# Altium schematic symbol library FPGA_Xilinx_Virtex7.SchLib: 34 symbols (part 4 of 26)
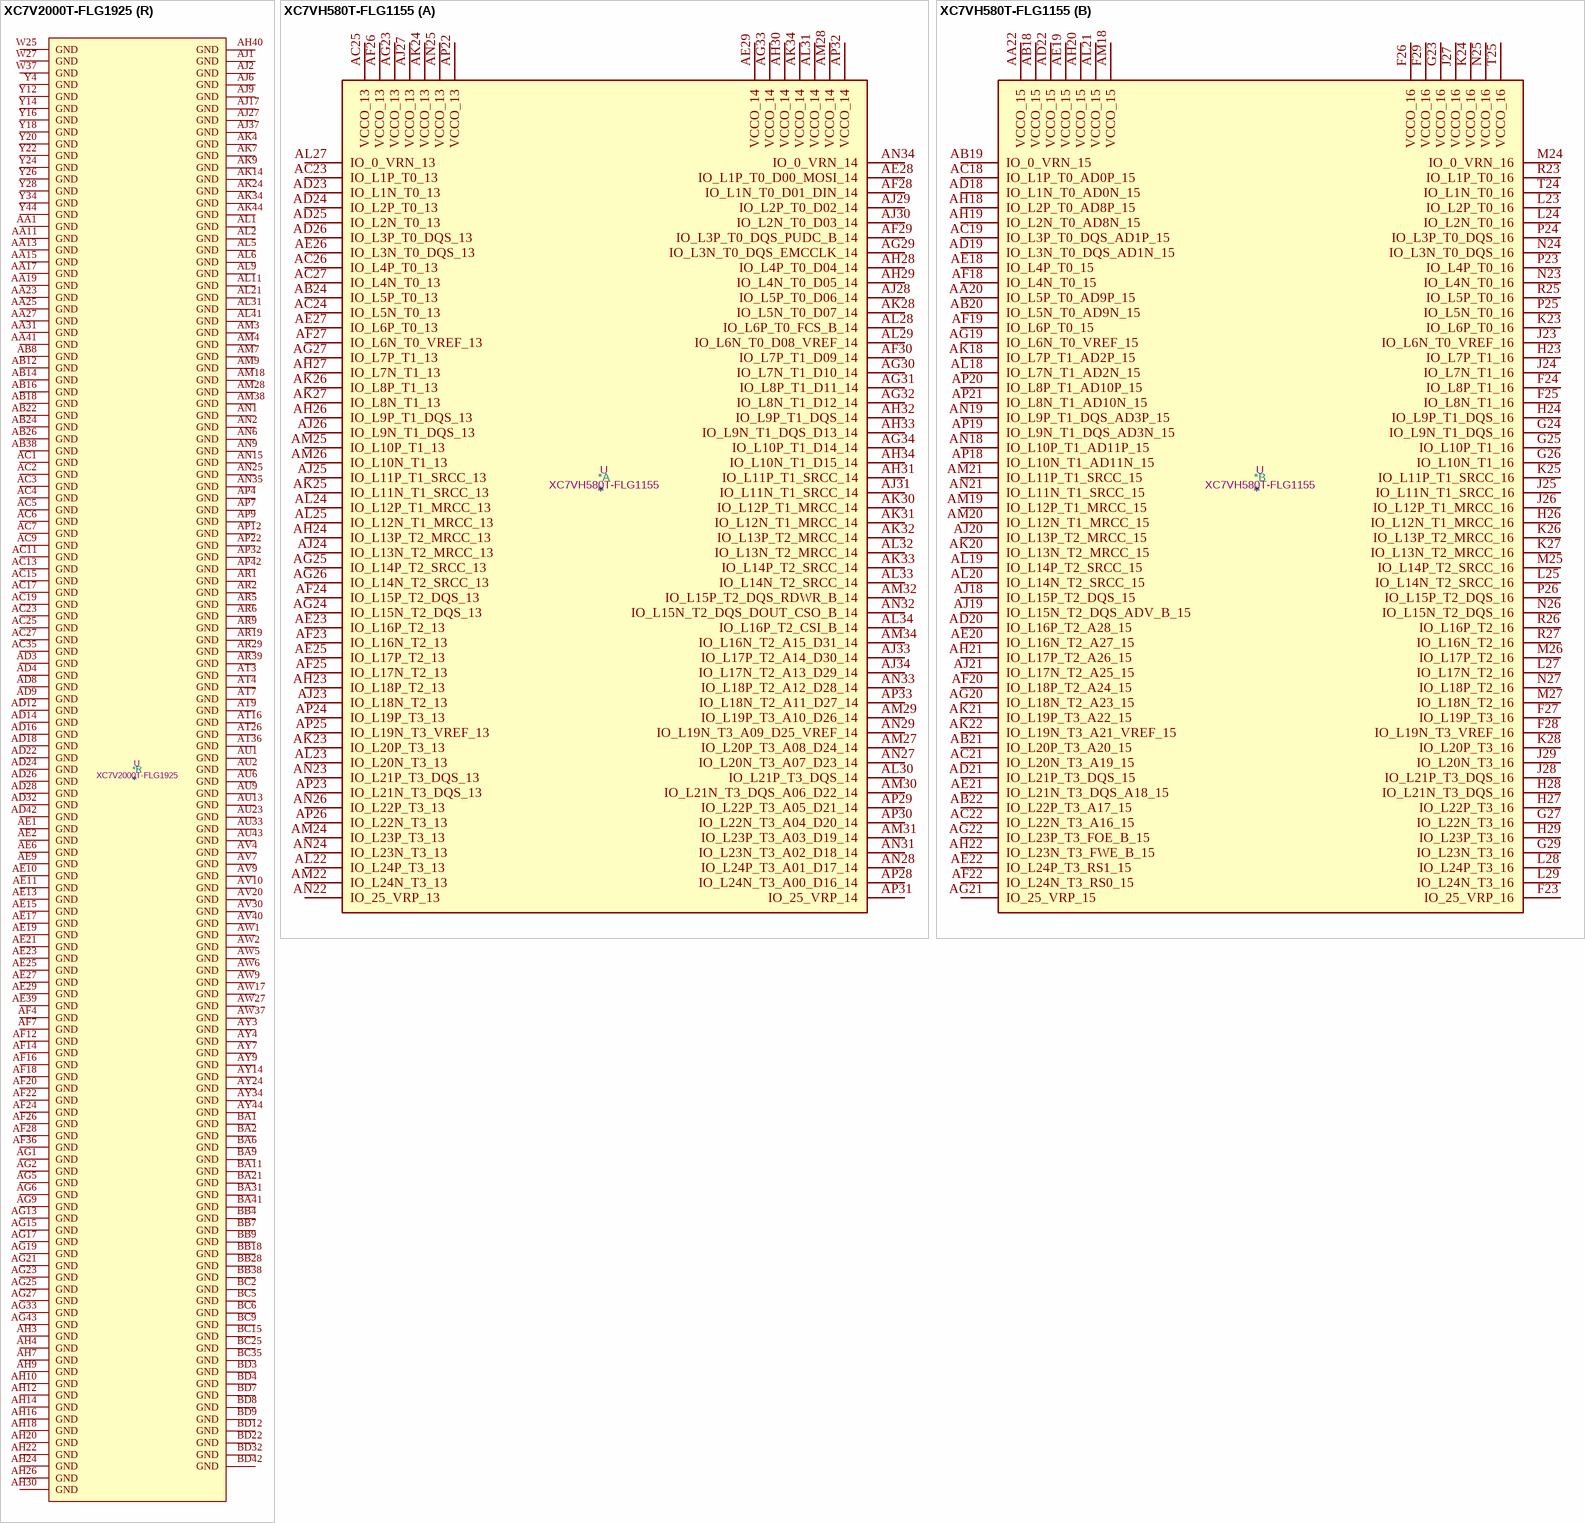
[diagram p175: symbols XC7V2000T-FLG1925 to XC7VH580T-FLG1155]

## XC7V2000T-FLG1925
designator *  value XC7V2000T-FLG1925  Reference: U
ki_keywords: FPGA; ki_description: Virtex 7 T 2000 XC7V2000T-FLG1925
part A pins: AN34 IO_0_VRN_12, AN36 IO_L6P_T0_12, AN37 IO_L2P_T0_12, AN38 IO_L2N_T0_12, AN39 IO_L7P_T1_12, AN40 VCCO_12, AN41 IO_L9P_T1_DQS_12, AP34 IO_L3P_T0_DQS_12, AP35 IO_L3N_T0_DQS_12, AP36 IO_L6N_T0_VREF_12, AP37 VCCO_12, AP38 IO_L4P_T0_12, AP39 IO_L4N_T0_12, AP40 IO_L7N_T1_12, AP41 IO_L9N_T1_DQS_12, AP43 IO_L8P_T1_12, AP44 IO_L8N_T1_12, AR34 VCCO_12, AR35 IO_L5P_T0_12, AR36 IO_L5N_T0_12, AR37 IO_L1P_T0_12, AR38 IO_L1N_T0_12, AR40 IO_L11P_T1_SRCC_12, AR41 IO_L11N_T1_SRCC_12, AR42 IO_L12P_T1_MRCC_12, AR43 IO_L10P_T1_12, AR44 VCCO_12, AT34 IO_25_VRP_12, AT35 IO_L20P_T3_12, AT37 IO_L19P_T3_12, AT38 IO_L19N_T3_VREF_12, AT39 IO_L14P_T2_SRCC_12, AT40 IO_L14N_T2_SRCC_12, AT41 VCCO_12, AT42 IO_L12N_T1_MRCC_12, AT43 IO_L10N_T1_12, AT44 IO_L16P_T2_12, AU34 IO_L22P_T3_12, AU35 IO_L20N_T3_12, AU36 IO_L21P_T3_DQS_12, AU37 IO_L21N_T3_DQS_12, AU38 VCCO_12, AU39 IO_L13P_T2_MRCC_12, AU40 IO_L13N_T2_MRCC_12, AU41 IO_L15P_T2_DQS_12, AU42 IO_L17P_T2_12, AU44 IO_L16N_T2_12, AV34 IO_L22N_T3_12, AV35 VCCO_12, AV36 IO_L24P_T3_12, AV37 IO_L24N_T3_12, AV38 IO_L23P_T3_12, AV39 IO_L23N_T3_12, AV41 IO_L15N_T2_DQS_12, AV42 IO_L17N_T2_12, AV43 IO_L18P_T2_12, AV44 IO_L18N_T2_12, AW34 IO_25_VRP_11, AW35 IO_L20P_T3_11, AW36 IO_0_VRN_11, AW38 IO_L15P_T2_DQS_11, AW39 IO_L15N_T2_DQS_11, AW40 IO_L1P_T0_11, AW41 IO_L1N_T0_11, AW42 VCCO_11, AW43 IO_L3P_T0_DQS_11, AW44 IO_L3N_T0_DQS_11, AY35 IO_L20N_T3_11, AY36 IO_L18P_T2_11, AY37 IO_L18N_T2_11, AY38 IO_L13P_T2_MRCC_11, AY39 VCCO_11, AY40 IO_L12P_T1_MRCC_11, AY41 IO_L5P_T0_11, AY42 IO_L5N_T0_11, AY43 IO_L2P_T0_11, BA34 IO_L19P_T3_11, BA35 IO_L22P_T3_11, BA36 VCCO_11, BA37 IO_L14P_T2_SRCC_11, BA38 IO_L14N_T2_SRCC_11, BA39 IO_L13N_T2_MRCC_11, BA40 IO_L12N_T1_MRCC_11, BA42 IO_L6P_T0_11, BA43 IO_L2N_T0_11, BA44 IO_L4P_T0_11, BB34 IO_L19N_T3_VREF_11, BB35 IO_L22N_T3_11, BB36 IO_L24P_T3_11, BB37 IO_L16P_T2_11, BB39 IO_L11P_T1_SRCC_11, BB40 IO_L11N_T1_SRCC_11, BB41 IO_L7P_T1_11, BB42 IO_L6N_T0_VREF_11, BB43 VCCO_11, BB44 IO_L4N_T0_11, BC34 IO_L23P_T3_11, BC36 IO_L24N_T3_11, BC37 IO_L16N_T2_11, BC38 IO_L17P_T2_11, BC39 IO_L10P_T1_11, BC40 VCCO_11, BC41 IO_L7N_T1_11, BC42 IO_L9P_T1_DQS_11, BC43 IO_L9N_T1_DQS_11, BD34 IO_L23N_T3_11, BD35 IO_L21P_T3_DQS_11, BD36 IO_L21N_T3_DQS_11, BD37 VCCO_11, BD38 IO_L17N_T2_11, BD39 IO_L10N_T1_11, BD40 IO_L8P_T1_11, BD41 IO_L8N_T1_11
part B pins: AD41 IO_L13P_T2_MRCC_14, AD43 IO_L15P_T2_DQS_RDWR_B_14, AD44 IO_L15N_T2_DQS_DOUT_CSO_B_14, AE30 IO_L20P_T3_A08_D24_14, AE31 IO_L20N_T3_A07_D23_14, AE32 IO_L4P_T0_D04_14, AE33 IO_L4N_T0_D05_14, AE34 VCCO_14, AE35 IO_L6P_T0_FCS_B_14, AE36 IO_0_VRN_14, AE37 IO_L8P_T1_D11_14, AE38 IO_L8N_T1_D12_14, AE40 IO_L12P_T1_MRCC_14, AE41 IO_L13N_T2_MRCC_14, AE42 IO_L14P_T2_SRCC_14, AE43 IO_L17P_T2_A14_D30_14, AE44 VCCO_14, AF29 IO_L22P_T3_A05_D21_14, AF30 IO_L22N_T3_A04_D20_14, AF31 VCCO_14, AF32 IO_L5P_T0_D06_14, AF33 IO_L1P_T0_D00_MOSI_14, AF34 IO_L1N_T0_D01_DIN_14, AF35 IO_L6N_T0_D08_VREF_14, AF37 IO_L10P_T1_D14_14, AF38 IO_L10N_T1_D15_14, AF39 IO_L11P_T1_SRCC_14, AF40 IO_L12N_T1_MRCC_14, AF41 VCCO_14, AF42 IO_L14N_T2_SRCC_14, AF43 IO_L17N_T2_A13_D29_14, AF44 IO_L18P_T2_A12_D28_14, AG29 IO_L19P_T3_A10_D26_14, AG30 IO_L19N_T3_A09_D25_VREF_14, AG31 IO_L24P_T3_A01_D17_14, AG32 IO_L5N_T0_D07_14, AG34 IO_L2P_T0_D02_14, AG35 IO_L2N_T0_D03_14, AG36 IO_L3P_T0_DQS_PUDC_B_14, AG37 IO_L3N_T0_DQS_EMCCLK_14, AG38 VCCO_14, AG39 IO_L9P_T1_DQS_14, AG40 IO_L11N_T1_SRCC_14, AG41 IO_L7P_T1_D09_14, AG42 IO_L16P_T2_CSI_B_14, AG44 IO_L18N_T2_A11_D27_14, AH28 IO_L21P_T3_DQS_14, AH29 IO_L21N_T3_DQS_A06_D22_14, AH31 IO_L24N_T3_A00_D16_14, AH32 IO_L23P_T3_13, AH33 IO_L23N_T3_13, AH34 IO_0_VRN_13, AH35 VCCO_13, AH36 IO_L7P_T1_13, AH37 IO_L8P_T1_13, AH38 IO_L8N_T1_13, AH39 IO_L9N_T1_DQS_D13_14, AH41 IO_L7N_T1_D10_14, AH42 IO_L16N_T2_A15_D31_14, AH43 IO_L2P_T0_13, AH44 IO_L2N_T0_13, AJ28 IO_25_VRP_14, AJ29 IO_L23P_T3_A03_D19_14, AJ30 IO_L23N_T3_A02_D18_14, AJ31 IO_25_VRP_13, AJ32 VCCO_13, AJ33 IO_L19P_T3_13, AJ34 IO_L19N_T3_VREF_13, AJ35 IO_L20P_T3_13, AJ36 IO_L7N_T1_13, AJ38 IO_L10P_T1_13, AJ39 IO_L6P_T0_13, AJ40 IO_L6N_T0_VREF_13, AJ41 IO_L1P_T0_13, AJ42 VCCO_13, AJ43 IO_L4P_T0_13, AJ44 IO_L4N_T0_13, AK29 VCCO_14, AK33 IO_L21P_T3_DQS_13, AK35 IO_L20N_T3_13, AK36 IO_L12P_T1_MRCC_13, AK37 IO_L12N_T1_MRCC_13, AK38 IO_L10N_T1_13, AK39 VCCO_13, AK40 IO_L5P_T0_13, AK41 IO_L1N_T0_13, AK42 IO_L3P_T0_DQS_13, AK43 IO_L3N_T0_DQS_13, AL33 IO_L21N_T3_DQS_13, AL34 IO_L22P_T3_13, AL35 IO_L24P_T3_13, AL36 VCCO_13, AL37 IO_L11P_T1_SRCC_13, AL38 IO_L11N_T1_SRCC_13, AL39 IO_L14P_T2_SRCC_13, AL40 IO_L5N_T0_13, AL42 IO_L16P_T2_13, AL43 IO_L16N_T2_13, AL44 IO_L18P_T2_13, AM34 IO_L22N_T3_13, AM35 IO_L24N_T3_13, AM36 IO_L9P_T1_DQS_13, AM37 IO_L9N_T1_DQS_13, AM39 IO_L14N_T2_SRCC_13, AM40 IO_L13P_T2_MRCC_13, AM41 IO_L13N_T2_MRCC_13, AM42 IO_L15P_T2_DQS_13, AM43 VCCO_13, AM44 IO_L18N_T2_13, AN42 IO_L15N_T2_DQS_13, AN43 IO_L17P_T2_13, AN44 IO_L17N_T2_13
part C pins: AA29 IO_L21P_T3_DQS_15, AA30 IO_L21N_T3_DQS_A18_15, AA32 IO_L6P_T0_15, AA33 IO_L6N_T0_VREF_15, AA34 IO_L2N_T0_AD8N_15, AA35 IO_0_VRN_15, AA36 VCCO_15, AA37 IO_L8N_T1_AD10N_15, AA38 IO_L12P_T1_MRCC_15, AA39 IO_L12N_T1_MRCC_15, AA40 IO_L14N_T2_SRCC_15, AA42 IO_L16P_T2_A28_15, AA43 IO_L16N_T2_A27_15, AA44 IO_L18N_T2_A23_15, AB28 IO_25_VRP_15, AB29 IO_L19P_T3_A22_15, AB30 IO_L19N_T3_A21_VREF_15, AB31 IO_L22P_T3_A17_15, AB32 IO_L22N_T3_A16_15, AB33 VCCO_15, AB34 IO_L2P_T0_AD8P_15, AB35 IO_L4P_T0_15, AB36 IO_L4N_T0_15, AB37 IO_L8P_T1_AD10P_15, AB39 IO_L11N_T1_SRCC_15, AB40 IO_L14P_T2_SRCC_15, AB41 IO_L13N_T2_MRCC_15, AB42 IO_L15N_T2_DQS_ADV_B_15, AB43 VCCO_15, AB44 IO_L18P_T2_A24_15, AC29 IO_L23N_T3_FWE_B_15, AC30 VCCO_15, AC31 IO_L20P_T3_A20_15, AC32 IO_L20N_T3_A19_15, AC33 IO_L1P_T0_AD0P_15, AC34 IO_L1N_T0_AD0N_15, AC36 IO_L9P_T1_DQS_AD3P_15, AC37 IO_L9N_T1_DQS_AD3N_15, AC38 IO_L10N_T1_AD11N_15, AC39 IO_L11P_T1_SRCC_15, AC40 VCCO_15, AC41 IO_L13P_T2_MRCC_15, AC42 IO_L15P_T2_DQS_15, AC43 IO_L17P_T2_A26_15, AC44 IO_L17N_T2_A25_15, AD29 IO_L23P_T3_FOE_B_15, AD30 IO_L24P_T3_RS1_15, AD31 IO_L24N_T3_RS0_15, AD33 IO_L3P_T0_DQS_AD1P_15, AD34 IO_L3N_T0_DQS_AD1N_15, AD35 IO_L5P_T0_AD9P_15, AD36 IO_L5N_T0_AD9N_15, AD37 VCCO_15, AD38 IO_L10P_T1_AD11P_15, AD39 IO_L7P_T1_AD2P_15, AD40 IO_L7N_T1_AD2N_15, U29 IO_25_VRP_16, U30 IO_L20P_T3_16, U31 IO_L20N_T3_16, U32 IO_0_VRN_16, U34 IO_L2P_T0_16, U35 IO_L2N_T0_16, U36 IO_L4P_T0_16, U37 IO_L4N_T0_16, U38 VCCO_16, U39 IO_L9P_T1_DQS_16, U40 IO_L9N_T1_DQS_16, U41 IO_L15P_T2_DQS_16, U42 IO_L15N_T2_DQS_16, V29 IO_L24N_T3_16, V31 IO_L19P_T3_16, V32 IO_L19N_T3_VREF_16, V33 IO_L1P_T0_16, V34 IO_L1N_T0_16, V35 VCCO_16, V36 IO_L8P_T1_16, V37 IO_L8N_T1_16, V38 IO_L7P_T1_16, V39 IO_L7N_T1_16, V41 IO_L13P_T2_MRCC_16, V42 IO_L13N_T2_MRCC_16, V43 IO_L17P_T2_16, V44 IO_L17N_T2_16, W29 IO_L24P_T3_16, W30 IO_L22P_T3_16, W31 IO_L22N_T3_16, W32 VCCO_16, W33 IO_L3P_T0_DQS_16, W34 IO_L3N_T0_DQS_16, W35 IO_L6P_T0_16, W36 IO_L6N_T0_VREF_16, W38 IO_L12P_T1_MRCC_16, W39 IO_L12N_T1_MRCC_16, W40 IO_L11N_T1_SRCC_16, W41 IO_L14N_T2_SRCC_16, W42 VCCO_16, W43 IO_L18P_T2_16, W44 IO_L18N_T2_16, Y29 VCCO_16, Y30 IO_L23P_T3_16, Y31 IO_L23N_T3_16, Y32 IO_L21P_T3_DQS_16, Y33 IO_L21N_T3_DQS_16, Y35 IO_L5P_T0_16, Y36 IO_L5N_T0_16, Y37 IO_L10P_T1_16, Y38 IO_L10N_T1_16, Y39 VCCO_16, Y40 IO_L11P_T1_SRCC_16, Y41 IO_L14P_T2_SRCC_16, Y42 IO_L16P_T2_16, Y43 IO_L16N_T2_16
part D pins: A22 IO_L17N_T2_17, A23 IO_L17P_T2_17, A24 IO_L18N_T2_17, A25 IO_L17N_T2_18, A26 VCCO_18, A27 IO_L18P_T2_18, A28 IO_L18N_T2_18, B22 IO_L15N_T2_DQS_17, B23 VCCO_17, B24 IO_L18P_T2_17, B25 IO_L17P_T2_18, B26 IO_L16P_T2_18, B27 IO_L16N_T2_18, C22 IO_L15P_T2_DQS_17, C23 IO_L13N_T2_MRCC_17, C24 IO_L14N_T2_SRCC_17, C26 IO_L15N_T2_DQS_18, C27 IO_L14P_T2_SRCC_18, C28 IO_L14N_T2_SRCC_18, D23 IO_L13P_T2_MRCC_17, D24 IO_L14P_T2_SRCC_17, D25 IO_L16N_T2_17, D26 IO_L15P_T2_DQS_18, D27 VCCO_18, D28 IO_L13P_T2_MRCC_18, D29 IO_L13N_T2_MRCC_18, E22 IO_L11N_T1_SRCC_17, E23 IO_L12N_T1_MRCC_17, E24 VCCO_17, E25 IO_L16P_T2_17, E26 IO_L11P_T1_SRCC_18, E27 IO_L11N_T1_SRCC_18, E28 IO_L12N_T1_MRCC_18, F22 IO_L11P_T1_SRCC_17, F23 IO_L12P_T1_MRCC_17, F24 IO_L9N_T1_DQS_17, F25 IO_L10N_T1_17, F27 IO_L9N_T1_DQS_18, F28 IO_L12P_T1_MRCC_18, F29 IO_L7N_T1_18, G22 IO_L20N_T3_17, G24 IO_L9P_T1_DQS_17, G25 IO_L10P_T1_17, G26 IO_L10N_T1_18, G27 IO_L9P_T1_DQS_18, G28 VCCO_18, G29 IO_L7P_T1_18, H21 IO_L24N_T3_17, H22 IO_L20P_T3_17, H23 IO_L7N_T1_17, H24 IO_L8N_T1_17, H25 VCCO_18, H26 IO_L10P_T1_18, H27 IO_L8P_T1_18, H28 IO_L8N_T1_18, J21 IO_L24P_T3_17, J22 VCCO_17, J23 IO_L7P_T1_17, J24 IO_L8P_T1_17, J25 IO_25_VRP_18, J26 IO_L23N_T3_18, J28 IO_L22N_T3_18, K21 IO_L23N_T3_17, K22 IO_L23P_T3_17, K23 IO_L19N_T3_VREF_17, K25 IO_L21N_T3_DQS_18, K26 IO_L23P_T3_18, K27 IO_L20N_T3_18, K28 IO_L22P_T3_18, L22 IO_L22N_T3_17, L23 IO_L19P_T3_17, L24 IO_L21N_T3_DQS_17, L25 IO_L21P_T3_DQS_18, L26 VCCO_18, L27 IO_L20P_T3_18, L28 IO_L19N_T3_VREF_18, M21 IO_25_VRP_17, M22 IO_L22P_T3_17, M23 VCCO_17, M24 IO_L21P_T3_DQS_17, M25 IO_L24P_T3_18, M26 IO_L24N_T3_18, M27 IO_L19P_T3_18, N21 IO_L3N_T0_DQS_17, N22 IO_L3P_T0_DQS_17, N23 IO_L5N_T0_17, N24 IO_L1N_T0_17, N26 IO_L4P_T0_18, N27 IO_L4N_T0_18, N28 IO_L5N_T0_18, P21 IO_L6N_T0_VREF_17, P23 IO_L5P_T0_17, P24 IO_L1P_T0_17, P25 IO_L6N_T0_VREF_18, P26 IO_L2N_T0_18, P27 VCCO_18, P28 IO_L5P_T0_18, R21 IO_L6P_T0_17, R22 IO_L4N_T0_17, R23 IO_L2N_T0_17, R24 VCCO_17, R25 IO_L6P_T0_18, R26 IO_L2P_T0_18, R27 IO_L3N_T0_DQS_18, R28 IO_L1N_T0_18, T21 VCCO_17, T22 IO_L4P_T0_17, T23 IO_L2P_T0_17, T24 IO_0_VRN_17, T25 IO_0_VRN_18, T27 IO_L3P_T0_DQS_18, T28 IO_L1P_T0_18
part E pins: A29 IO_L17P_T2_19, A30 IO_L17N_T2_19, A32 IO_L15P_T2_DQS_19, A33 IO_L15N_T2_DQS_19, B29 IO_L18N_T2_19, B30 IO_L16P_T2_19, B31 IO_L16N_T2_19, B32 IO_L9N_T1_DQS_19, B33 VCCO_19, C29 IO_L18P_T2_19, C30 VCCO_19, C31 IO_L13N_T2_MRCC_19, C32 IO_L9P_T1_DQS_19, C33 IO_L7N_T1_19, D30 IO_L13P_T2_MRCC_19, D31 IO_L12N_T1_MRCC_19, D33 IO_L7P_T1_19, E30 IO_L14N_T2_SRCC_19, E31 IO_L12P_T1_MRCC_19, E32 IO_L11N_T1_SRCC_19, E33 IO_L10N_T1_19, F30 IO_L14P_T2_SRCC_19, F31 VCCO_19, F32 IO_L11P_T1_SRCC_19, F33 IO_L10P_T1_19, G30 IO_L24N_T3_19, G31 IO_L8P_T1_19, G32 IO_L8N_T1_19, H29 IO_L24P_T3_19, H31 IO_L19P_T3_19, H32 IO_L19N_T3_VREF_19, H33 IO_L20N_T3_19, J29 IO_25_VRP_19, J30 IO_L21N_T3_DQS_19, J31 IO_L22N_T3_19, J32 VCCO_19, J33 IO_L20P_T3_19, K29 VCCO_19, K30 IO_L21P_T3_DQS_19, K31 IO_L22P_T3_19, K32 IO_L23P_T3_19, K33 IO_L23N_T3_19, L29 IO_L5P_T0_19, L30 IO_L5N_T0_19, L32 IO_L2P_T0_19, L33 IO_L2N_T0_19, M29 IO_L3N_T0_DQS_19, M30 IO_L1P_T0_19, M31 IO_L1N_T0_19, M32 IO_L6N_T0_VREF_19, M33 VCCO_19, M39 IO_L6P_T0_20, M40 IO_L6N_T0_VREF_20, M41 IO_L8N_T1_20, N29 IO_L3P_T0_DQS_19, N30 VCCO_19, N31 IO_L6P_T0_19, N32 IO_L4P_T0_19, N33 IO_L4N_T0_19, N34 IO_0_VRN_20, N36 IO_L2P_T0_20, N37 IO_L2N_T0_20, N38 IO_L4P_T0_20, N39 IO_L4N_T0_20, N40 VCCO_20, N41 IO_L8P_T1_20, N42 IO_L10N_T1_20, N43 IO_L15N_T2_DQS_20, N44 IO_L17N_T2_20, P29 IO_0_VRN_19, P30 IO_L24P_T3_20, P31 IO_L24N_T3_20, P33 IO_L20P_T3_20, P34 IO_L20N_T3_20, P35 IO_L1P_T0_20, P36 IO_L1N_T0_20, P37 VCCO_20, P38 IO_L12N_T1_MRCC_20, P39 IO_L11P_T1_SRCC_20, P40 IO_L11N_T1_SRCC_20, P41 IO_L10P_T1_20, P43 IO_L15P_T2_DQS_20, P44 IO_L17P_T2_20, R30 IO_L21P_T3_DQS_20, R31 IO_L21N_T3_DQS_20, R32 IO_L22P_T3_20, R33 IO_L22N_T3_20, R34 VCCO_20, R35 IO_L3N_T0_DQS_20, R36 IO_L5P_T0_20, R37 IO_L5N_T0_20, R38 IO_L12P_T1_MRCC_20, R40 IO_L13P_T2_MRCC_20, R41 IO_L13N_T2_MRCC_20, R42 IO_L14N_T2_SRCC_20, R43 IO_L16N_T2_20, R44 VCCO_20, T29 IO_L23P_T3_20, T30 IO_L23N_T3_20, T31 VCCO_20, T32 IO_25_VRP_20, T33 IO_L19P_T3_20, T34 IO_L19N_T3_VREF_20, T35 IO_L3P_T0_DQS_20, T37 IO_L9P_T1_DQS_20, T38 IO_L9N_T1_DQS_20, T39 IO_L7P_T1_20, T40 IO_L7N_T1_20, T41 VCCO_20, T42 IO_L14P_T2_SRCC_20, T43 IO_L16P_T2_20, T44 IO_L18N_T2_20, U44 IO_L18P_T2_20
part F pins: A34 IO_L4N_T0_22, A35 IO_L1N_T0_22, A36 VCCO_22, A37 IO_L8P_T1_22, A38 IO_L8N_T1_22, A39 IO_L18P_T2_22, A40 IO_L18N_T2_22, A42 IO_L15N_T2_DQS_22, B34 IO_L4P_T0_22, B35 IO_L1P_T0_22, B36 IO_L5N_T0_22, B37 IO_L10N_T1_22, B39 IO_L16P_T2_22, B40 IO_L16N_T2_22, B41 IO_L15P_T2_DQS_22, B42 IO_L17N_T2_22, B43 VCCO_22, C34 IO_L2N_T0_22, C36 IO_L5P_T0_22, C37 IO_L10P_T1_22, C38 IO_L12P_T1_MRCC_22, C39 IO_L12N_T1_MRCC_22, C40 VCCO_22, C41 IO_L13N_T2_MRCC_22, C42 IO_L17P_T2_22, C43 IO_L22P_T3_22, C44 IO_L22N_T3_22, D34 IO_L2P_T0_22, D35 IO_L3P_T0_DQS_22, D36 IO_L3N_T0_DQS_22, D37 VCCO_22, D38 IO_L11N_T1_SRCC_22, D39 IO_L14P_T2_SRCC_22, D40 IO_L14N_T2_SRCC_22, D41 IO_L13P_T2_MRCC_22, D43 IO_L21P_T3_DQS_22, D44 IO_L21N_T3_DQS_22, E34 VCCO_22, E35 IO_L6N_T0_VREF_22, E36 IO_L7P_T1_22, E37 IO_L7N_T1_22, E38 IO_L11P_T1_SRCC_22, E40 IO_L19N_T3_VREF_22, E41 IO_L20P_T3_22, E42 IO_L20N_T3_22, E43 IO_L24N_T3_22, E44 VCCO_22, F34 IO_0_VRN_22, F35 IO_L6P_T0_22, F37 IO_25_VRP_22, F38 IO_L9P_T1_DQS_22, F39 IO_L9N_T1_DQS_22, F40 IO_L19P_T3_22, F41 VCCO_22, F42 IO_L24P_T3_22, F43 IO_L23P_T3_22, F44 IO_L23N_T3_22, G34 IO_L2P_T0_21, G35 IO_L2N_T0_21, G36 IO_L4P_T0_21, G37 IO_L4N_T0_21, G38 VCCO_21, G39 IO_L1P_T0_21, G40 IO_L1N_T0_21, G41 IO_L7P_T1_21, G42 IO_L7N_T1_21, G44 IO_L16N_T2_21, H34 IO_0_VRN_21, H35 VCCO_21, H36 IO_L6P_T0_21, H37 IO_L6N_T0_VREF_21, H38 IO_L5N_T0_21, H39 IO_L3N_T0_DQS_21, H41 IO_L11N_T1_SRCC_21, H42 IO_L9P_T1_DQS_21, H43 IO_L9N_T1_DQS_21, H44 IO_L16P_T2_21, J34 IO_L22P_T3_21, J35 IO_L22N_T3_21, J36 IO_L19N_T3_VREF_21, J38 IO_L5P_T0_21, J39 IO_L3P_T0_DQS_21, J40 IO_L12N_T1_MRCC_21, J41 IO_L11P_T1_SRCC_21, J42 VCCO_21, J43 IO_L18P_T2_21, J44 IO_L18N_T2_21, K35 IO_25_VRP_21, K36 IO_L19P_T3_21, K37 IO_L20N_T3_21, K38 IO_L10N_T1_21, K39 VCCO_21, K40 IO_L12P_T1_MRCC_21, K41 IO_L14P_T2_SRCC_21, K42 IO_L14N_T2_SRCC_21, K43 IO_L15N_T2_DQS_21, L34 IO_L23P_T3_21, L35 IO_L23N_T3_21, L36 VCCO_21, L37 IO_L20P_T3_21, L38 IO_L10P_T1_21, L39 IO_L8P_T1_21, L40 IO_L8N_T1_21, L42 IO_L13N_T2_MRCC_21, L43 IO_L15P_T2_DQS_21, L44 IO_L17N_T2_21, M34 IO_L24P_T3_21, M35 IO_L24N_T3_21, M36 IO_L21P_T3_DQS_21, M37 IO_L21N_T3_DQS_21, M42 IO_L13P_T2_MRCC_21, M43 VCCO_21, M44 IO_L17P_T2_21
part G pins: AJ10 IO_L2N_T0_31, AJ11 IO_L2P_T0_31, AJ12 VCCO_31, AJ13 IO_0_VRN_31, AJ14 IO_25_VRP_32, AJ15 IO_L23N_T3_32, AJ16 IO_L23P_T3_32, AK10 IO_L6N_T0_VREF_31, AK11 IO_L6P_T0_31, AK12 IO_L4N_T0_31, AK13 IO_L4P_T0_31, AK15 IO_L21N_T3_DQS_32, AK16 IO_L21P_T3_DQS_32, AL10 IO_L5P_T0_31, AL12 IO_L3N_T0_DQS_31, AL13 IO_L3P_T0_DQS_31, AL14 IO_L24N_T3_32, AL15 IO_L24P_T3_32, AL16 VCCO_32, AM10 IO_L5N_T0_31, AM11 IO_L1N_T0_31, AM12 IO_L1P_T0_31, AM13 VCCO_31, AM14 IO_L22N_T3_32, AM15 IO_L22P_T3_32, AM16 IO_L19N_T3_VREF_32, AM17 IO_L19P_T3_32, AN10 VCCO_31, AN11 IO_L9N_T1_DQS_31, AN12 IO_L9P_T1_DQS_31, AN13 IO_L10P_T1_31, AN14 IO_L20P_T3_32, AN16 IO_L17N_T2_32, AN17 IO_L17P_T2_32, AP10 IO_L7P_T1_31, AP11 IO_L11P_T1_SRCC_31, AP13 IO_L10N_T1_31, AP14 IO_L20N_T3_32, AP15 IO_L15N_T2_DQS_32, AP16 IO_L15P_T2_DQS_32, AP17 VCCO_32, AR10 IO_L7N_T1_31, AR11 IO_L11N_T1_SRCC_31, AR12 IO_L12P_T1_MRCC_31, AR13 IO_L8P_T1_31, AR14 VCCO_32, AR15 IO_L18N_T2_32, AR16 IO_L18P_T2_32, AR17 IO_L16P_T2_32, AT10 IO_L15P_T2_DQS_31, AT11 VCCO_31, AT12 IO_L12N_T1_MRCC_31, AT13 IO_L8N_T1_31, AT14 IO_L10P_T1_32, AT15 IO_L13P_T2_MRCC_32, AT17 IO_L16N_T2_32, AU10 IO_L15N_T2_DQS_31, AU11 IO_L13N_T2_MRCC_31, AU12 IO_L13P_T2_MRCC_31, AU14 IO_L10N_T1_32, AU15 IO_L13N_T2_MRCC_32, AU16 IO_L14N_T2_SRCC_32, AU17 IO_L14P_T2_SRCC_32, AV11 IO_L14N_T2_SRCC_31, AV12 IO_L14P_T2_SRCC_31, AV13 IO_25_VRP_31, AV14 IO_L8P_T1_32, AV15 VCCO_32, AV16 IO_L11P_T1_SRCC_32, AV17 IO_0_VRN_32, AW10 IO_L17P_T2_31, AW11 IO_L16P_T2_31, AW12 VCCO_31, AW13 IO_L18P_T2_31, AW14 IO_L8N_T1_32, AW15 IO_L11N_T1_SRCC_32, AW16 IO_L12P_T1_MRCC_32, AY10 IO_L17N_T2_31, AY11 IO_L16N_T2_31, AY12 IO_L21P_T3_DQS_31, AY13 IO_L18N_T2_31, AY15 IO_L9P_T1_DQS_32, AY16 IO_L12N_T1_MRCC_32, AY17 IO_L7P_T1_32, BA10 IO_L19P_T3_31, BA12 IO_L21N_T3_DQS_31, BA13 IO_L6N_T0_VREF_32, BA14 IO_L6P_T0_32, BA15 IO_L9N_T1_DQS_32, BA16 VCCO_32, BA17 IO_L7N_T1_32, BB10 IO_L19N_T3_VREF_31, BB11 IO_L20P_T3_31, BB12 IO_L23P_T3_31, BB13 VCCO_31, BB14 IO_L4N_T0_32, BB15 IO_L4P_T0_32, BB16 IO_L1N_T0_32, BB17 IO_L1P_T0_32, BC10 VCCO_31, BC11 IO_L20N_T3_31, BC12 IO_L23N_T3_31, BC13 IO_L24P_T3_31, BC14 IO_L2P_T0_32, BC16 IO_L3N_T0_DQS_32, BC17 IO_L3P_T0_DQS_32, BD10 IO_L22N_T3_31, BD11 IO_L22P_T3_31, BD13 IO_L24N_T3_31, BD14 IO_L2N_T0_32, BD15 IO_L5N_T0_32, BD16 IO_L5P_T0_32, BD17 VCCO_32
part H pins: AJ18 IO_25_VRP_33, AJ19 IO_L23N_T3_33, AJ20 IO_L23P_T3_33, AJ21 IO_25_VRP_34, AJ22 VCCO_34, AJ23 IO_L24P_T3_34, AJ24 IO_L24N_T3_34, AK17 IO_L21P_T3_DQS_33, AK18 IO_L19P_T3_33, AK19 VCCO_33, AK20 IO_L22P_T3_33, AK21 IO_L20P_T3_34, AK22 IO_L20N_T3_34, AK23 IO_L22P_T3_34, AL17 IO_L21N_T3_DQS_33, AL18 IO_L19N_T3_VREF_33, AL19 IO_L24P_T3_33, AL20 IO_L22N_T3_33, AL22 IO_L23P_T3_34, AL23 IO_L22N_T3_34, AL24 IO_L19P_T3_34, AM19 IO_L24N_T3_33, AM20 IO_L20P_T3_33, AM21 IO_L21P_T3_DQS_34, AM22 IO_L23N_T3_34, AM23 VCCO_34, AM24 IO_L19N_T3_VREF_34, AN18 IO_L16P_T2_33, AN19 IO_L20N_T3_33, AN20 VCCO_33, AN21 IO_L21N_T3_DQS_34, AN22 IO_L18P_T2_34, AN23 IO_L18N_T2_34, AN24 IO_L17P_T2_34, AP18 IO_L16N_T2_33, AP19 IO_L17N_T2_33, AP20 IO_L17P_T2_33, AP21 IO_L15P_T2_DQS_33, AP23 IO_L14P_T2_SRCC_34, AP24 IO_L17N_T2_34, AR18 IO_L18P_T2_33, AR20 IO_L13P_T2_MRCC_33, AR21 IO_L15N_T2_DQS_33, AR22 IO_L15P_T2_DQS_34, AR23 IO_L14N_T2_SRCC_34, AR24 VCCO_34, AR25 IO_L16P_T2_34, AT18 IO_L18N_T2_33, AT19 IO_L11P_T1_SRCC_33, AT20 IO_L13N_T2_MRCC_33, AT21 VCCO_33, AT22 IO_L15N_T2_DQS_34, AT23 IO_L13P_T2_MRCC_34, AT24 IO_L13N_T2_MRCC_34, AT25 IO_L16N_T2_34, AU18 VCCO_33, AU19 IO_L11N_T1_SRCC_33, AU20 IO_L14N_T2_SRCC_33, AU21 IO_L14P_T2_SRCC_33, AU22 IO_L9P_T1_DQS_34, AU24 IO_L11P_T1_SRCC_34, AU25 IO_L11N_T1_SRCC_34, AV18 IO_L12N_T1_MRCC_33, AV19 IO_L12P_T1_MRCC_33, AV21 IO_0_VRN_33, AV22 IO_L9N_T1_DQS_34, AV23 IO_L7P_T1_34, AV24 IO_L12P_T1_MRCC_34, AV25 VCCO_34, AW18 IO_L10N_T1_33, AW19 IO_L10P_T1_33, AW20 IO_L9P_T1_DQS_33, AW21 IO_L7P_T1_33, AW22 VCCO_34, AW23 IO_L7N_T1_34, AW24 IO_L12N_T1_MRCC_34, AW25 IO_0_VRN_34, AY18 IO_L8P_T1_33, AY19 VCCO_33, AY20 IO_L9N_T1_DQS_33, AY21 IO_L7N_T1_33, AY22 IO_L10P_T1_34, AY23 IO_L10N_T1_34, AY25 IO_L8P_T1_34, BA18 IO_L8N_T1_33, BA19 IO_L6P_T0_33, BA20 IO_L2P_T0_33, BA22 IO_L6P_T0_34, BA23 IO_L6N_T0_VREF_34, BA24 IO_L2P_T0_34, BA25 IO_L8N_T1_34, BB19 IO_L6N_T0_VREF_33, BB20 IO_L2N_T0_33, BB21 IO_L1P_T0_33, BB22 IO_L4P_T0_34, BB23 VCCO_34, BB24 IO_L1P_T0_34, BB25 IO_L2N_T0_34, BC18 IO_L4P_T0_33, BC19 IO_L5P_T0_33, BC20 VCCO_33, BC21 IO_L1N_T0_33, BC22 IO_L4N_T0_34, BC23 IO_L5P_T0_34, BC24 IO_L1N_T0_34, BD18 IO_L4N_T0_33, BD19 IO_L5N_T0_33, BD20 IO_L3N_T0_DQS_33, BD21 IO_L3P_T0_DQS_33, BD23 IO_L5N_T0_34, BD24 IO_L3P_T0_DQS_34, BD25 IO_L3N_T0_DQS_34
part I pins: AJ25 IO_L24P_T3_35, AJ26 IO_L22P_T3_35, AK25 IO_L24N_T3_35, AK26 IO_L22N_T3_35, AK27 IO_L20P_T3_35, AK28 IO_25_VRP_35, AK30 IO_L21P_T3_DQS_36, AK31 IO_L21N_T3_DQS_36, AK32 IO_25_VRP_36, AL25 IO_L21P_T3_DQS_35, AL26 VCCO_35, AL27 IO_L23P_T3_35, AL28 IO_L20N_T3_35, AL29 IO_L23P_T3_36, AL30 IO_L23N_T3_36, AL32 IO_L19P_T3_36, AM25 IO_L21N_T3_DQS_35, AM26 IO_L19P_T3_35, AM27 IO_L23N_T3_35, AM29 IO_L24P_T3_36, AM30 IO_L22P_T3_36, AM31 IO_L22N_T3_36, AM32 IO_L19N_T3_VREF_36, AM33 VCCO_36, AN26 IO_L19N_T3_VREF_35, AN27 IO_L18P_T2_35, AN28 IO_L18N_T2_35, AN29 IO_L24N_T3_36, AN30 VCCO_36, AN31 IO_L20P_T3_36, AN32 IO_L20N_T3_36, AN33 IO_L16P_T2_36, AP25 IO_L17P_T2_35, AP26 IO_L17N_T2_35, AP27 VCCO_35, AP28 IO_L15P_T2_DQS_35, AP29 IO_L17P_T2_36, AP30 IO_L17N_T2_36, AP31 IO_L13P_T2_MRCC_36, AP33 IO_L16N_T2_36, AR26 IO_L13P_T2_MRCC_35, AR27 IO_L13N_T2_MRCC_35, AR28 IO_L15N_T2_DQS_35, AR30 IO_L18P_T2_36, AR31 IO_L13N_T2_MRCC_36, AR32 IO_L14P_T2_SRCC_36, AR33 IO_L15P_T2_DQS_36, AT27 IO_L14P_T2_SRCC_35, AT28 IO_L14N_T2_SRCC_35, AT29 IO_L16P_T2_35, AT30 IO_L18N_T2_36, AT31 VCCO_36, AT32 IO_L14N_T2_SRCC_36, AT33 IO_L15N_T2_DQS_36, AU26 IO_L12P_T1_MRCC_35, AU27 IO_L12N_T1_MRCC_35, AU28 VCCO_35, AU29 IO_L16N_T2_35, AU30 IO_L12P_T1_MRCC_36, AU31 IO_L12N_T1_MRCC_36, AU32 IO_L11P_T1_SRCC_36, AV26 IO_L10P_T1_AD15P_35, AV27 IO_L11P_T1_SRCC_35, AV28 IO_L11N_T1_SRCC_35, AV29 IO_0_VRN_35, AV31 IO_L10P_T1_36, AV32 IO_L11N_T1_SRCC_36, AV33 IO_0_VRN_36, AW26 IO_L10N_T1_AD15N_35, AW28 IO_L9P_T1_DQS_AD7P_35, AW29 IO_L9N_T1_DQS_AD7N_35, AW30 IO_L8P_T1_36, AW31 IO_L10N_T1_36, AW32 VCCO_36, AW33 IO_L7P_T1_36, AY26 IO_L8P_T1_AD14P_35, AY27 IO_L8N_T1_AD14N_35, AY28 IO_L7P_T1_AD6P_35, AY29 VCCO_35, AY30 IO_L8N_T1_36, AY31 IO_L9P_T1_DQS_36, AY32 IO_L9N_T1_DQS_36, AY33 IO_L7N_T1_36, BA26 VCCO_35, BA27 IO_L5P_T0_AD13P_35, BA28 IO_L5N_T0_AD13N_35, BA29 IO_L7N_T1_AD6N_35, BA30 IO_L6P_T0_36, BA32 IO_L5P_T0_36, BA33 IO_L5N_T0_36, BB26 IO_L3P_T0_DQS_AD5P_35, BB27 IO_L3N_T0_DQS_AD5N_35, BB29 IO_L2P_T0_AD12P_35, BB30 IO_L6N_T0_VREF_36, BB31 IO_L3P_T0_DQS_36, BB32 IO_L3N_T0_DQS_36, BB33 VCCO_36, BC26 IO_L1P_T0_AD4P_35, BC27 IO_L6P_T0_35, BC28 IO_L6N_T0_VREF_35, BC29 IO_L2N_T0_AD12N_35, BC30 VCCO_36, BC31 IO_L2P_T0_36, BC32 IO_L2N_T0_36, BC33 IO_L1P_T0_36, BD26 IO_L1N_T0_AD4N_35, BD27 VCCO_35, BD28 IO_L4P_T0_35, BD29 IO_L4N_T0_35, BD30 IO_L4P_T0_36, BD31 IO_L4N_T0_36, BD33 IO_L1N_T0_36